# Altium footprint library cool_library.PcbLib: 1182 footprints (part 60 of 75)
Each footprint in its own frame and in the unit in brackets; x right, y up, seen from the top. Pads: shape width x height; smd on the part's side, far side on the other; paste and mask are expansions set on the pad; w line width, h text height; cw(c..) or ccw(c..) is an arc to the next point about the centre after c.
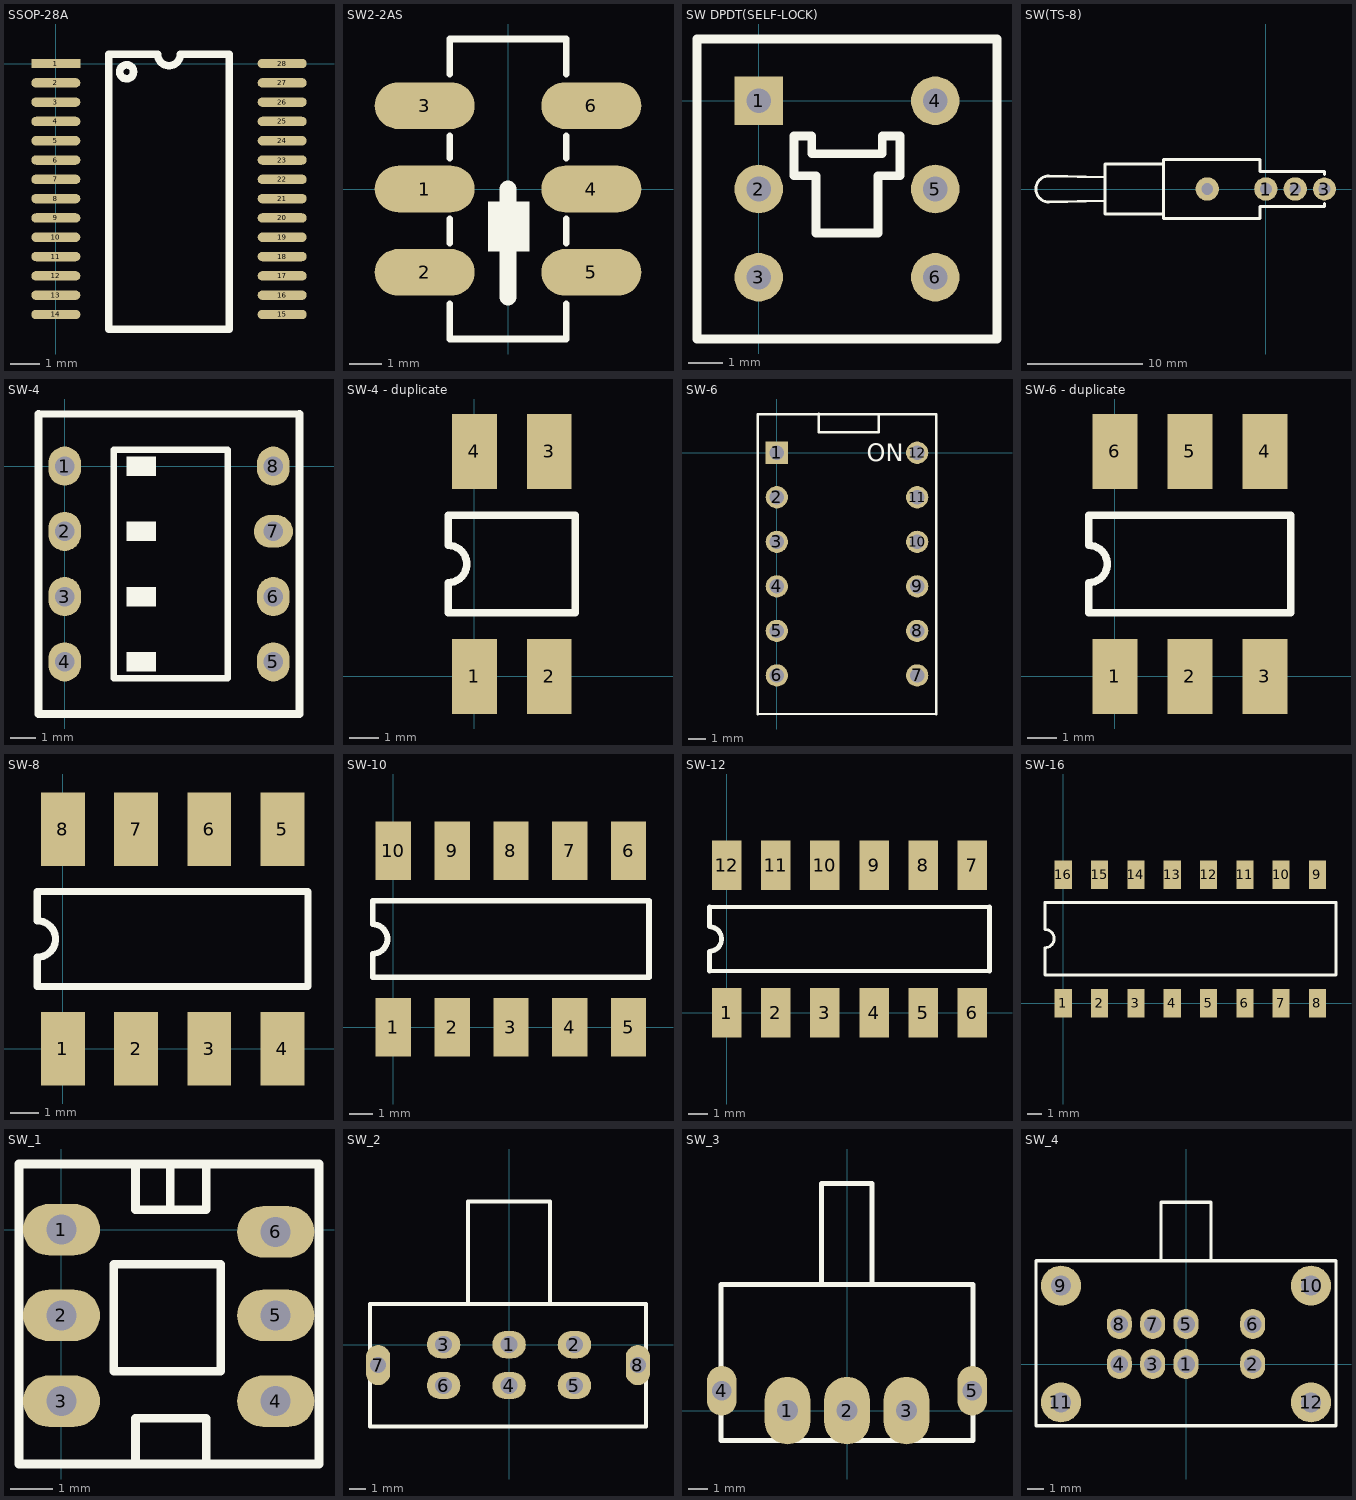
[diagram p59: the footprints below, top view; thin cyan lines are the x and y axes]

## SSOP-28A [mil]
pads (28):
  rect 65x12.5 smd: 1(0,0)
  oval 65x12.5 smd: 2(0,-25.59) 3(0,-51.18) 4(0,-76.77) 5(0,-102.36) 6(0,-127.95) 7(0,-153.54) 8(0,-179.13) 9(0,-204.72) 10(0,-230.31) 11(0,-255.91) 12(0,-281.5) 13(0,-307.09) 14(0,-332.68) 15(300,-332.68) 16(300,-307.09) 17(300,-281.5) 18(300,-255.91) 19(300,-230.31) 20(300,-204.72) 21(300,-179.13) 22(300,-153.54) 23(300,-127.95) 24(300,-102.36) 25(300,-76.77) 26(300,-51.18) 27(300,-25.59) 28(300,0)
Top Overlay:
  circle w10: c93.78,-11 r9.22
  lines w10: 70,-352 230,-352 230,12 165,12 cw(c150,12) 135,12 70,12 70,-352

## SW2-2AS [mil]
pads (6):
  oval 120x56 smd: 1(-100,0) 2(-100,-100) 3(-100,100) 4(100,0) 5(100,-100) 6(100,100)
Top Overlay:
  region: -24,-15 -24,-75 26,-75 26,-15
  lines w8: -70,-138 -70,-180 70,-180 70,-138 ; -70,-65 -70,-36 ; -70,37 -70,64 ; -70,138 -70,180 70,180 70,138 ; 70,-65 70,-36 ; 70,37 70,64
  lines w20: 0,-130 0,0

## SW DPDT(SELF-LOCK) [mil]
pads (6):
  rect 55x55 hole 28: 1(0,0)
  round 55 hole 28: 2(0,-100) 3(0,-200) 4(200,0) 5(200,-100) 6(200,-200)
Top Overlay:
  lines w10: -70,-270 -70,70 270,70 270,-270 -70,-270 ; 40,-85 40,-40 60,-40 60,-60 140,-60 140,-40 160,-40 160,-85 135,-85 135,-150 65,-150 65,-85 40,-85

## SW(TS-8) [mil]
pads (4):
  round 80 hole 40: 1(0,0) 2(100,0) ""(-200,0)
  round 78.74 hole 40: 3(200,0)
Top Overlay:
  lines w10: -550,-40 -740,-45 cw(c-740,0) -740,45 -550,40 ; -350,-85 -550,-85 -550,85 -350,85 ; 200,-50 200,-60 -20,-60 -20,-100 -350,-100 -350,100 -20,100 -20,60 200,60 200,50

## SW-4 [mil]
pads (8):
  oval 50x60 hole 30: 1(0,0) 2(0,-100) 3(0,-200) 4(0,-300) 5(320,-300) 6(320,-200) 8(320,0)
  oval 60x50 hole 30: 7(320,-100)
Top Overlay:
  rectangle: 95,-15 140,15
  rectangle: 95,-115 140,-85
  rectangle: 95,-215 140,-185
  rectangle: 95,-315 140,-285
  lines w10: -40,80 360,80 ; 75,-325 250,-325 250,25 75,25 75,-325
  lines w12: -40,80 -40,-380 360,-380 360,80

## SW-4 - duplicate [mil]
pads (4):
  rect 60x100 smd: 1(0,0) 2(100,0) 3(100,300) 4(0,300)
Top Overlay:
  lines w10: -35,85 -35,125 ccw(c-35,150) -35,175 -35,215 135,215 135,85 -35,85

## SW-6 [mil]
pads (12):
  rect 50x50 hole 32: 1(0,0)
  round 50 hole 32: 2(0,-100) 3(0,-200) 4(0,-300) 5(0,-400) 6(0,-500) 7(314.96,-500) 8(314.96,-400) 9(314.96,-300) 10(314.96,-200) 11(314.96,-100) 12(314.96,0)
Top Overlay:
  lines w3.94: -43.31,-586.61 358.27,-586.61
  lines w5.91: -43.31,-586.61 -43.31,86.61 358.27,86.61 358.27,-586.61 ; 94,87 94,46 229,46 229,86.61
  text "ON" at 202,-19 h39.37
3D body: height 244.09, standoff 0, extent -43,-587 358,86
3D body: height 255.91, standoff 0, extent 95,-16 229,16
3D body: height 255.91, standoff 0, extent 96,-117 230,-85
3D body: height 255.91, standoff 0, extent 96,-215 230,-183
3D body: height 255.91, standoff 0, extent 96,-317 230,-285
3D body: height 255.91, standoff 0, extent 96,-418 230,-386
3D body: height 255.91, standoff 0, extent 96,-515 230,-483

## SW-6 - duplicate [mil]
pads (6):
  rect 60x100 smd: 1(0,0) 2(100,0) 3(200,0) 4(200,300) 5(100,300) 6(0,300)
Top Overlay:
  lines w10: -35,85 135,85 235,85 235,215 135,215 -35,215 -35,175 cw(c-35,150) -35,125 -35,85

## SW-8 [mil]
pads (8):
  rect 60x100 smd: 1(0,0) 2(100,0) 3(200,0) 4(300,0) 5(300,300) 6(200,300) 7(100,300) 8(0,300)
Top Overlay:
  lines w10: -35,85 335,85 335,215 -35,215 -35,175 cw(c-35,150) -35,125 -35,85

## SW-10 [mil]
pads (10):
  rect 60x100 smd: 1(0,0) 2(100,0) 3(200,0) 4(300,0) 5(400,0) 6(400,300) 7(300,300) 8(200,300) 9(100,300) 10(0,300)
Top Overlay:
  lines w10: -35,85 435,85 435,215 -35,215 -35,175 cw(c-35,150) -35,125 -35,85

## SW-12 [mil]
pads (12):
  rect 60x100 smd: 1(0,0) 2(100,0) 3(200,0) 4(300,0) 5(400,0) 6(500,0) 7(500,300) 8(400,300) 9(300,300) 10(200,300) 11(100,300) 12(0,300)
Top Overlay:
  lines w8: -35,85 535,85 ; -35,215 535,215
  lines w10: -35,85 -35,125 ccw(c-35,150) -35,175 -35,215 ; 535,85 535,215

## SW-16 [mm]
pads (16):
  rect 1.2x2 smd: 1(0,0) 2(2.54,0) 3(5.08,0) 4(7.62,0) 5(10.16,0) 6(12.7,0) 7(15.24,0) 8(17.78,0) 9(17.78,8.992) 10(15.24,8.992) 11(12.7,8.992) 12(10.16,8.992) 13(7.62,8.992) 14(5.08,8.992) 15(2.54,8.992) 16(0,8.992)
Top Overlay:
  lines w0.2: -1.27,1.981 -1.27,3.886 ccw(c-1.27,4.521) -1.27,5.156 -1.27,7.061 ; 19.075,1.981 19.075,7.061
  lines w0.203: -1.27,1.981 8.915,1.981 13.995,1.981 19.075,1.981 ; -1.27,7.061 8.915,7.061 13.995,7.061 19.075,7.061

## SW_1 [mm]
pads (6):
  oval 1.8x1.2 hole 0.7: 1(0,0) 2(0,-2) 3(0,-4) 4(5,-4) 5(5,-2) 6(5,-0.051)
Top Overlay:
  lines w0.2: 1.727,-5.468 1.727,-4.401 3.378,-4.401 3.378,-5.468 ; 1.727,1.532 1.727,0.466 3.378,0.466 3.378,1.532 ; 2.54,0.466 2.54,1.532
  lines w0.203: -0.991,-5.468 6.009,-5.468 6.009,1.532 -0.991,1.532 -0.991,-5.468 ; 1.219,-3.304 1.219,-0.804 3.719,-0.804 3.719,-3.304 1.219,-3.304

## SW_2 [mil]
pads (8):
  oval 82x67 hole 41.34: 1(0,0) 2(160,0) 3(-160,0) 4(0,-100) 5(160,-100) 6(-160,-100)
  oval 59.06x98.43 hole 39.37: 7(-320,-50) 8(315,-50)
Top Overlay:
  lines w9.84: -99.92,99.81 -99.92,349.81 100.08,349.81 100.08,99.81 ; -339.92,-200.19 335.08,-200.19 335.08,99.81 -339.92,99.81 -339.92,-200.19

## SW_3 [mm]
pads (5):
  oval 2.3x3.4 hole 1.05: 1(-3,0) 2(0,0) 3(3,0)
  oval 1.5x2.5 hole 1: 4(-6.31,1) 5(6.31,1)
Top Overlay:
  lines w0.254: -1.28,6.362 -1.28,11.442 1.26,11.442 1.26,6.362 ; -6.36,-1.512 6.34,-1.512 6.34,6.362 -6.36,6.362 -6.36,-1.512

## SW_4 [mm]
pads (12):
  oval 1.5x1.8 hole 1.05: 1(0,0) 2(4,0) 3(-2,0) 4(-4,0) 5(0,2.4) 6(4,2.4) 7(-2,2.4) 8(-4,2.4)
  round 2.4 hole 1.2: 9(-7.5,4.703) 10(7.5,4.703) 11(-7.5,-2.297) 12(7.5,-2.297)
Top Overlay:
  lines w0.2: -9,-3.697 9,-3.697 9,6.203 -9,6.203 -9,-3.697 ; -1.5,6.203 -1.5,9.703 1.5,9.703 1.5,6.203 -1.5,6.203